# Altium footprint library AltiumLibrary.PcbLib: 130 footprints (part 9 of 9)
Each footprint in its own frame and in the unit in brackets; x right, y up, seen from the top. Pads: shape width x height; smd on the part's side, far side on the other; paste and mask are expansions set on the pad; w line width, h text height; cw(c..) or ccw(c..) is an arc to the next point about the centre after c.
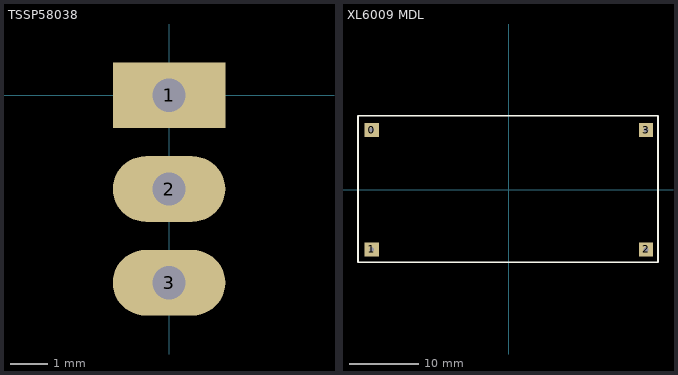
[diagram p8: the footprints below, top view; thin cyan lines are the x and y axes]

## TSSP58038 [mil]
pads (3):
  rect 120x70 hole 35.43: 1(0,0)
  oval 120x70 hole 35.43: 2(0,-100) 3(0,-200)
3D body "tssp58038.stp": height 336.61, standoff -864.17, extent -133.86,-212.79 55.12,14.76

## XL6009 MDL [mil]
pads (4):
  rect 80x80 hole 27.56: 0(-777,338) 1(-777,-338) 2(777,-338) 3(777,338)
Top Overlay:
  lines w10: -855,-410.63 845,-410.63 845,419.37 -855,419.37 -855,-410.63
3D body "XL6009.stp": height 501.93, standoff -205.07, extent -849.99,-414.99 850.01,415